# Altium integrated library CONNECTORS-D-TYPE.IntLib: 10 symbols
Pins are listed as number, name and electrical type; pins without a type are passive.

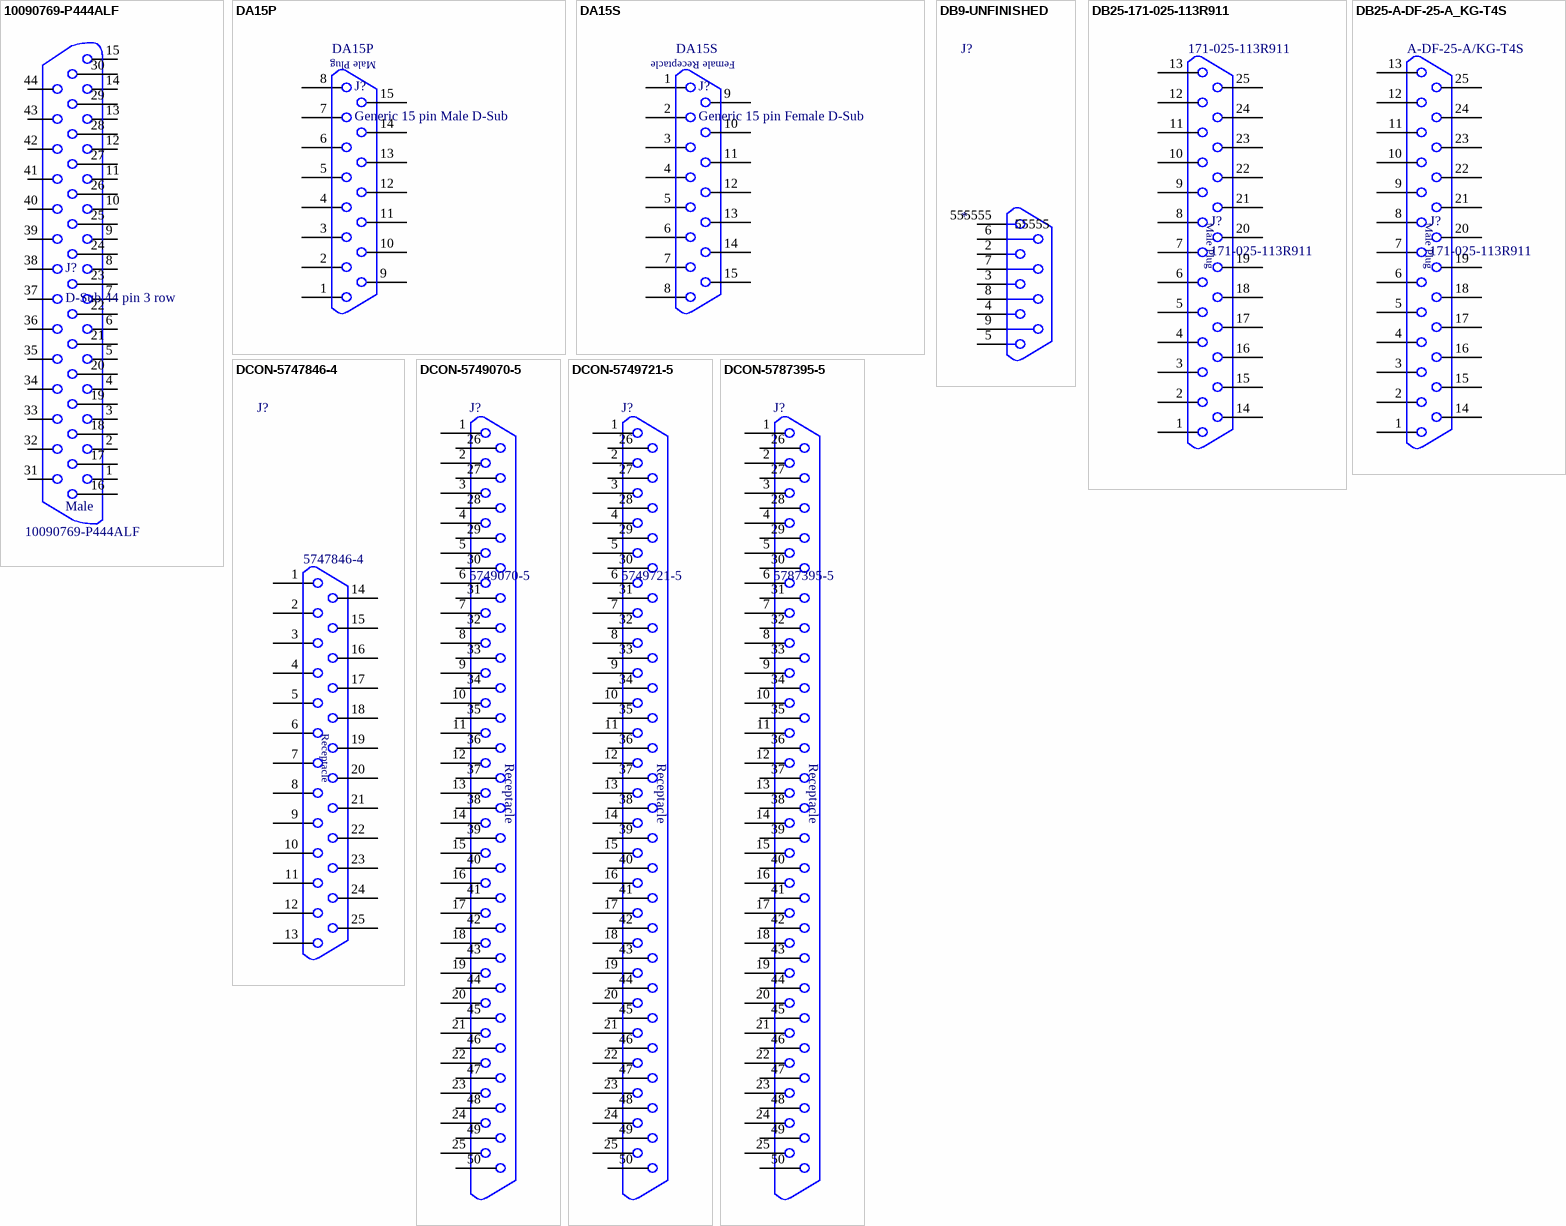
[diagram p0: symbols 10090769-P444ALF to DCON-5787395-5]

## 10090769-P444ALF
designator J?, comment D-Sub 44 pin 3 row  Part Number: 10090769-P444ALF
Connector, D-Sub, 44 pin, Soldercup, 3 row; Manufacturer: FCI; Mates With: 10090770-S444ALF; Rows: 3; Substitute: A-HDS-44-LL/Z; Mounting Type: Cable, soldercup, free-hanging; PackageDescription: D-Sub 44 pin free-hanging, male pins; PackageReference: 10090769-P444ALF; Pins: 44; Pitch: *; Supplier 1: Digi-Key; Supplier Part Number 1: 609-4044-ND; Supplier 2: Mouser; Supplier Part Number 2: 649-10090769-P444ALF; Supplier 3: Allied; Supplier Part Number 3: 70408740
pins: 1, 2, 3, 4, 5, 6, 7, 8, 9, 10, 11, 12, 13, 14, 15, 16, 17, 18, 19, 20, 21, 22, 23, 24, 25, 26, 27, 28, 29, 30, 31, 32, 33, 34, 35, 36, 37, 38, 39, 40, 41, 42, 43, 44
text: Male

## DA15P
designator J?, comment Generic 15 pin Male D-Sub  Part Number: DA15P
Connector, D-Sub 15 pin male; Mates With: DA15S; Rows: 2; Manufacturer: *; Pins: 15
pins: 1, 2, 3, 4, 5, 6, 7, 8, 9, 10, 11, 12, 13, 14, 15
text: Male Plug

## DA15S
designator J?, comment Generic 15 pin Female D-Sub  Part Number: DA15S
Connector, D-Sub 15 pin female; Mates With: DA15P; Rows: 2; Manufacturer: *; Pins: 15
pins: 1, 2, 3, 4, 5, 6, 7, 8, 9, 10, 11, 12, 13, 14, 15
text: Female Receptacle

## DB9-UNFINISHED
designator J?
Manufacturer: Assmann WSW Components; Mates With: DB9 female/socket.; Mounting Type: Through Hole; PackageDescription: D-Sub 9 pin right angle, male pinout; PackageReference: *; Part Number: *; Pins: *; Rows: *; Pitch: *
pins: 2, 3, 4, 5, 6, 7, 8, 9, 555555 55555

## DB25-171-025-113R911
designator J?, comment 171-025-113R911
Connector, D-Sub, 25 pin, Vertical, Male/Plug, Thru-Hole, PCB; Manufacturer: Norcomp Inc.; Mates With: DB25 female receptacle; Rows: 2; Mounting Type: Through Hole; PackageDescription: D-Sub 25 pin vertical, male pins; PackageReference: 171-025-113R911; Pins: 25; Pitch: *; Supplier 1: Mouser; Supplier Part Number 1: 636-171-025-113R911; Supplier 2: Digi-Key; Supplier Part Number 2: 9225ME-ND; Supplier 3: Newark; Supplier Part Number 3: 40Y4672; Part Number: 171-025-113R911
pins: 1, 2, 3, 4, 5, 6, 7, 8, 9, 10, 11, 12, 13, 14, 15, 16, 17, 18, 19, 20, 21, 22, 23, 24, 25
text: Male Plug

## DB25-A-DF-25-A_KG-T4S
designator J?, comment 171-025-113R911  Part Number: A-DF-25-A/KG-T4S
Connector, D-Sub, 25 pin, Right Angle, Male/Plug, Thru-Hole, PCB; Manufacturer: Assmann WSW Components; Mates With: DB25 female receptacle; Rows: 2; Mounting Type: Through Hole; PackageDescription: D-Sub 25 pin vertical, male pins; PackageReference: A-DF-25-A-KG-T4S; Pins: 25; Pitch: *; Supplier 1: Digi-Key; Supplier Part Number 1: AE10980-ND
footprint D-A-DF-25-A_KG-T4S (D-Sub board mount connector, right angle, 25 pin, male.  Board lock and Grounding indents)
3D model ADS25A-KG-T (PCB3D Model)
signal-integrity model Generic Connector (Dsub-25 generic connector transmission line model)
pins: 1, 2, 3, 4, 5, 6, 7, 8, 9, 10, 11, 12, 13, 14, 15, 16, 17, 18, 19, 20, 21, 22, 23, 24, 25
text: Male Plug

## DCON-5747846-4
designator J?, comment 5747846-4
Connector, D-Sub, 25 pin, Right Angle, Female/Receptacle,; Manufacturer: TE Connectivity; Mates With: DB25 male plug; Rows: 2; Mounting Type: Through Hole, Right Angle; PackageDescription: D-Sub 25 pin right angle, female pinout; PackageReference: 5747846-1; Pins: 25; Pitch: *; Features: Mating connector lock, Board lock; Supplier 1: Mouser; Supplier Part Number 1: 571-5747846-4; Supplier 2: Digi-Key; Supplier Part Number 2: A32126-ND; Supplier 3: Allied; Supplier Part Number 3: 70041681; Supplier 4: Newark; Supplier Part Number 4: 42K7485; Part Number: 5747846-4
footprint 5747846-1 (D-Sub 25 pin Right Angle, Female footprint.)
3D model D-SUB-5747846-04 (PCB3D Model)
signal-integrity model Model Name (Model Description)
pins: 1, 2, 3, 4, 5, 6, 7, 8, 9, 10, 11, 12, 13, 14, 15, 16, 17, 18, 19, 20, 21, 22, 23, 24, 25
text: Receptacle

## DCON-5749070-5
designator J?, comment 5749070-5
0.050 pitch, SCSI II Receptacle,  Vertical Board mount, w/o Latchblocks; Manufacturer: TE Connectivity; Mates With: 5750913-5, 1-5750913-5, 5749111-4, 5749621-5, 5749210-5, 5749699-5, 5-750450-1, 5390377-5; Rows: 4; Pitch: .05; Mounting Type: Through Hole; PackageDescription: .050 Through-hole; PackageReference: *; Part Number: 5749070-5; Pins: 50
footprint 5749XXX-5 (50 Pin SCSI connector, Vertical, through hole w/ 4-40 screw holes)
3D model SCSI-VERT (PCB3D Model)
pins: 1, 2, 3, 4, 5, 6, 7, 8, 9, 10, 11, 12, 13, 14, 15, 16, 17, 18, 19, 20, 21, 22, 23, 24, 25, 26, 27, 28, 29, 30, 31, 32, 33, 34, 35, 36, 37, 38, 39, 40, 41, 42, 43, 44, 45, 46, 47, 48, 49, 50
text: Receptacle

## DCON-5749721-5
designator J?, comment 5749721-5
0.050 pitch, SCSI II Receptacle,  Vertical Board mount, w/ Latchblocks; Manufacturer: TE Connectivity; Mates With: 5750913-5, 1-5750913-5, 5749111-4, 5749621-5, 5749210-5, 5749699-5, 5-750450-1, 5390377-5; Rows: 4; Pitch: .05; Mounting Type: Through Hole; PackageDescription: .050 Through-hole; PackageReference: *; Part Number: 5749721-5; Pins: 50; Supplier 1: Mouser; Supplier Part Number 1: 571-5749721-5; Supplier 2: Digi-Key; Supplier Part Number 2: A31825-ND; Supplier 3: Newark; Supplier Part Number 3: 42K7534
footprint 5749XXX-5 (50 Pin SCSI connector, Vertical, through hole w/ 4-40 screw holes)
3D model SCSI-VERT (PCB3D Model)
pins: 1, 2, 3, 4, 5, 6, 7, 8, 9, 10, 11, 12, 13, 14, 15, 16, 17, 18, 19, 20, 21, 22, 23, 24, 25, 26, 27, 28, 29, 30, 31, 32, 33, 34, 35, 36, 37, 38, 39, 40, 41, 42, 43, 44, 45, 46, 47, 48, 49, 50
text: Receptacle

## DCON-5787395-5
designator J?, comment 5787395-5
0.050 pitch, SCSI II Receptacle,  Right Angle, w Latchblocks, with boardlocks; Manufacturer: TE Connectivity; Mates With: 5750913-5, 1-5750913-5, 5749111-4, 5749621-5, 5749210-5, 5749699-5, 5-750450-1, 5390377-5; Rows: 4; Pitch: .05; Mounting Type: Through Hole; PackageDescription: .050 Through-hole; PackageReference: *; Part Number: 5787395-5; Pins: 50; Supplier 1: Mouser; Supplier Part Number 1: 571-5787395-5; Supplier 2: Allied; Supplier Part Number 2: 70288045; Supplier 3: Mouser; Supplier Part Number 3: 571-7873955; Supplier 4: Digi-Key; Supplier Part Number 4: A31813-ND
3D model SCSI-RA (PCB3D Model)
footprint 5787XXX-5S (50 Pin SCSI connector, Right angle, through hole w/ board locks, S pattern)
pins: 1, 2, 3, 4, 5, 6, 7, 8, 9, 10, 11, 12, 13, 14, 15, 16, 17, 18, 19, 20, 21, 22, 23, 24, 25, 26, 27, 28, 29, 30, 31, 32, 33, 34, 35, 36, 37, 38, 39, 40, 41, 42, 43, 44, 45, 46, 47, 48, 49, 50
text: Receptacle